# Altium footprint library th.PcbLib: 51 footprints (part 3 of 4)
Each footprint in its own frame and in the unit in brackets; x right, y up, seen from the top. Pads: shape width x height; smd on the part's side, far side on the other; paste and mask are expansions set on the pad; w line width, h text height; cw(c..) or ccw(c..) is an arc to the next point about the centre after c.
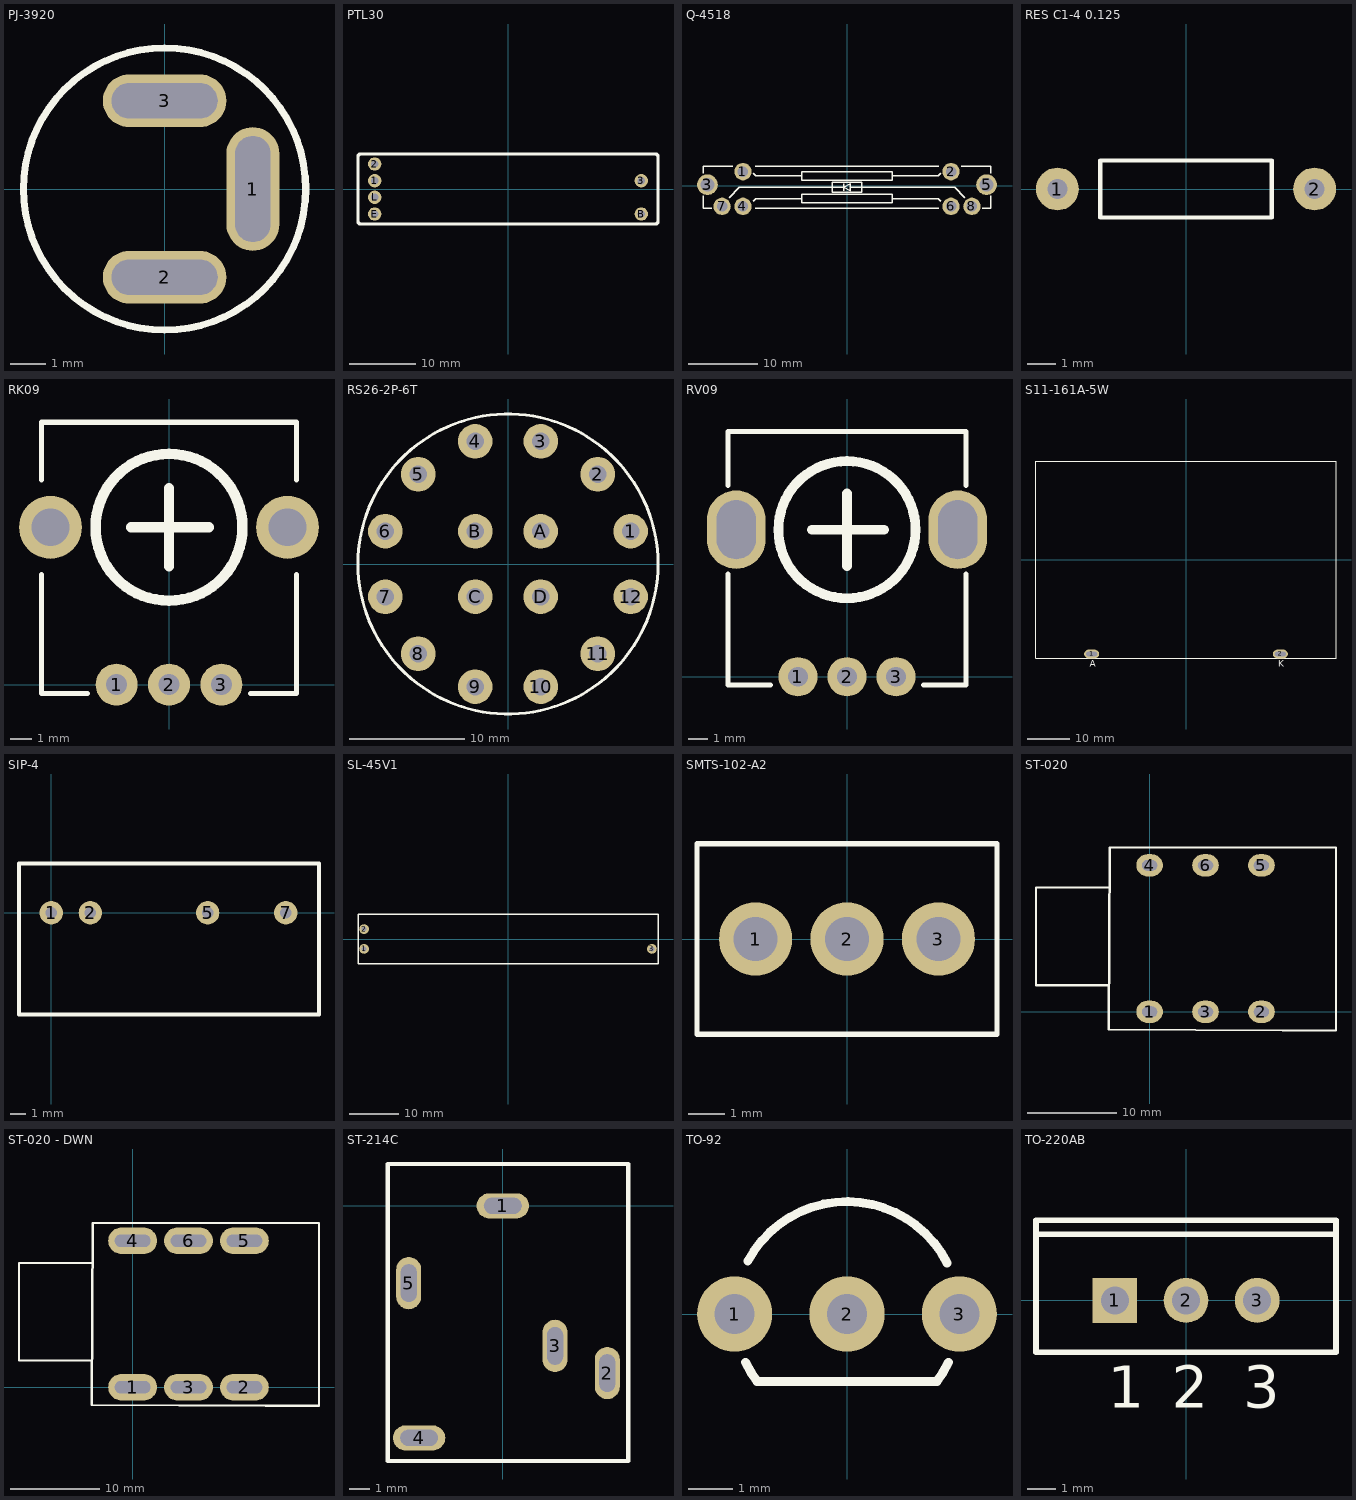
[diagram p2: the footprints below, top view; thin cyan lines are the x and y axes]

## PJ-3920 [mm] "3.5 jack"
pads (3):
  oval 1.5x3.5 hole 1 slot 3 at 90 deg: 1(2.5,0)
  oval 3.5x1.5 hole 1 slot 3 at 0 deg: 2(0,-2.5) 3(0,2.5)
Top Overlay:
  circle w0.2: c0,0 r4
3D body "PJ3920.STEP": height 16.2, standoff -6.35, extent -4,-4 4,4

## PTL30 [mm]
pads (6):
  round 2 hole 1.1: 1(-20,1.25) 2(-20,3.75) 3(20,1.25) B(20,-3.75) E(-20,-3.75) L(-20,-1.25)
Top Overlay:
  lines w0.5: -22.5,-5 -22.5,5 -22.25,5.25 22.25,5.25 22.5,5 22.5,-5 22.25,-5.25 -22.25,-5.25 -22.5,-5
3D body "PTL30.STEP": height 22.91, standoff -3.39, extent -22.5,-4.5 22.5,4.5

## Q-4518 [mm]
pads (8):
  round 2.5 hole 1.5: 1(-15,2) 2(15,2) 4(-15,-3) 6(15,-3) 7(-18,-3) 8(18,-3)
  round 3 hole 2: 3(-20.121,0.121) 5(20.121,0.121)
Top Overlay:
  lines w0.2: -20.75,-1.5 -20.75,-3.275 -19.5,-3.275 ; -20.75,1.75 -20.75,2.75 -16.5,2.75 ; -17,-1.75 -15.5,-0.25 -1.25,-0.25 -0.5,-0.25 ; -13.5,-2.25 -13.125,-1.875 -6.5,-1.875 ; -13.5,1.75 -13.125,1.375 -6.5,1.375 ; -13.25,-3.25 13.25,-3.25 ; -13.25,2.75 13.25,2.75 ; -0.5,-0.75 -0.5,0.25 ; 0.5,-0.25 1.25,-0.25 2.125,-0.25 15.5,-0.25 17,-1.75 ; 6.5,-1.875 13.125,-1.875 13.5,-2.25 ; 6.5,1.375 13.125,1.375 13.5,1.75 ; 16.5,2.75 20.75,2.75 20.75,1.75 ; 19.5,-3.275 20.75,-3.275 20.75,-1.5 ; -0.5,-0.25 0.5,-0.75 0.5,0.25 -0.5,-0.25 ; -6.5,-2.5 6.5,-2.5 6.5,-1.25 -6.5,-1.25 -6.5,-2.5 ; -6.5,0.75 -6.5,2 6.5,2 6.5,0.75 -6.5,0.75 ; -2.125,-1 -2.125,0.5 2.125,0.5 2.125,-1 -2.125,-1
3D body "Q-4518.STEP": height 28.2, standoff -4.88, extent -20.6,-3.25 20.6,2.649

## RES C1-4 0.125 [mm]
pads (2):
  round 1.5 hole 0.7: 1(-4.5,0) 2(4.5,0)
Top Overlay:
  lines w0.15: -3,-1 -3,1 3,1 3,-1 2,-1 -3,-1
3D body "C1-4.STEP": height 2.65, standoff -2.5, extent -4.74,-1.15 4.74,1.15

## RK09 [mm]
pads (5):
  round 2 hole 1: 1(-2.5,0) 2(0,0) 3(2.5,0)
  round 3 hole 1.8: " "(-5.65,7.5) " "(5.65,7.5)
Top Overlay:
  circle w0.5: c0,7.5 r3.5
  lines w0.254: -6.075,5.25 -6.075,-0.425 -3.9,-0.425 ; -6.075,9.75 -6.075,12.5 6.075,12.5 6.075,9.75 ; 3.9,-0.425 6.075,-0.425 6.075,5.25
  lines w0.5: -1.8,7.5 1.9,7.5 ; 0,5.65 0,9.35
3D body "RK09.STEP": height 26.51, standoff -4.99, extent -6,-0.4 6,12.45

## RS26-2P-6T [mm]
pads (16):
  round 3 hole 1.5: 1(10.625,2.847) 2(7.778,7.778) 3(2.847,10.625) 4(-2.847,10.625) 5(-7.778,7.778) 6(-10.625,2.847) 7(-10.625,-2.847) 8(-7.778,-7.778) 9(-2.847,-10.625) 10(2.847,-10.625) 11(7.778,-7.778) 12(10.625,-2.847) A(2.828,2.828) B(-2.828,2.828) C(-2.828,-2.828) D(2.828,-2.828)
Top Overlay:
  circle w0.254: c0,0 r13
3D body "RS26-2P-6T.STEP": height 31.01, standoff -3.99, extent -13,-13 13,13

## RV09 [mm]
pads (5):
  round 2 hole 1: 1(-2.5,0) 2(0,0) 3(2.5,0)
  oval 3x4 hole 2 slot 3 at 90 deg: " "(-5.65,7.5) " "(5.65,7.5)
Top Overlay:
  circle w0.5: c0,7.5 r3.5
  lines w0.254: -6.075,5.25 -6.075,-0.425 -3.9,-0.425 ; -6.075,9.75 -6.075,12.5 6.075,12.5 6.075,9.75 ; 3.9,-0.425 6.075,-0.425 6.075,5.25
  lines w0.5: -1.8,7.5 1.9,7.5 ; 0,5.65 0,9.35
3D body "rv09.STEP": height 19.59, standoff -2.71, extent -5.922,-0.25 5.922,12.2

## S11-161A-5W [mm]
pads (2):
  oval 3.5x2 hole 1 slot 2.5 at 0 deg: 1(-22,-22) 2(22,-22)
Top Overlay:
  lines w0.254: -22,-23 0,-23 22,-23 ; -35,-23 -35,23 35,23 35,-23 -35,-23
  text "A" at -22.5,-25 h1.52
  text "K" at 21.5,-25 h1.52
3D body: height 0, standoff -3, extent 21,-22.3 23,-21.7
3D body: height 0, standoff -3, extent -23,-22.3 -21,-21.7
3D body: height 3, standoff 0, extent -35,-23 35,23

## SIP-4 [mil]
pads (4):
  round 60 hole 30: 1(0,0) 2(100,0) 5(400,0) 7(600,0)
Top Overlay:
  lines w10: -82.68,-259.84 -82.68,125.98 685.04,125.98 685.04,-259.84 -82.68,-259.84
3D body "H05xxS-1W.STEP": height 494.09, standoff -139.76, extent -84.65,-255.91 683.07,129.92

## SL-45V1 [mm]
pads (3):
  round 2 hole 1: 1(-29.25,-2) 2(-29.25,2) 3(29.25,-2)
Top Overlay:
  lines w0.3: -30.5,-5 -30.5,5 30.5,5 30.5,-5 -30.5,-5
3D body "SL-45V1-A10K.STEP": height 16.5, standoff -2.5, extent -30,-4.75 30,4.75

## SMTS-102-A2 [mm]
pads (3):
  round 2 hole 1.2: 1(-2.5,0) 2(0,0) 3(2.5,0)
Top Overlay:
  lines w0.15: -4.1,-2.6 0,-2.6 4.1,-2.6 4.1,2.6 0,2.6 -4.1,2.6 -4.1,-2.6
3D body "SMTS-102-A2.STEP": height 27.71, standoff -5.39, extent -6,-6 6.75,6

## ST-020 [mm]
pads (6):
  oval 3x2.5 hole 1.2 slot 1.7 at 0 deg: 1(0,0) 2(12.6,0) 3(6.3,0) 4(0,16.5) 5(12.6,16.5) 6(6.3,16.5)
Top Overlay:
  lines w0.254: -4.576,3 -12.8,3 -12.8,8.5 -12.8,14 -4.522,14 ; -4.6,-2 15,-2.1 21,-2.1 21,18.5 14.5,18.5 -4.5,18.5 -4.6,-2
3D body "7-0085.STEP": height 21.95, standoff -3.29, extent -12.775,-1.8 20.525,18.2

## ST-020 - DWN [mm]
pads (6):
  oval 5.5x3 hole 1.4 slot 4 at 0 deg: 1(0,0) 2(12.6,0) 3(6.3,0) 4(0,16.5) 5(12.6,16.5) 6(6.3,16.5)
Top Overlay:
  lines w0.254: -4.576,3 -12.8,3 -12.8,8.5 -12.8,14 -4.522,14 ; -4.6,-2 15,-2.1 21,-2.1 21,18.5 14.5,18.5 -4.5,18.5 -4.6,-2
3D body "7-0085.STEP": height 16.75, standoff -8.49, extent -12.75,-1.7 20.55,18.3

## ST-214C [mm]
pads (5):
  oval 2.5x1.2 hole 0.762 slot 1.8 at 0 deg: 1(0,0) 4(-4,-11.1)
  oval 1.2x2.5 hole 0.762 slot 1.8 at 90 deg: 2(5,-8) 3(2.5,-6.7) 5(-4.5,-3.7)
Top Overlay:
  lines w0.2: -5.5,-12.2 6,-12.2 6,2 -5.5,2 -5.5,-12.2
3D body "ST-214C.STEP": height 6.01, standoff -3.49, extent -5.5,-12.2 6,5.4

## TO-92 [mm]
pads (3):
  round 1.7 hole 0.9: 1(-2.54,0) 2(0,0) 3(2.54,0)
Top Overlay:
  lines w0.2: -2.293,-1.092 ccw(c0,0) -2.032,-1.524 ; -2.242,1.194 cw(c0,0) 2.262,1.155 ; -2.032,-1.525 2.032,-1.525 ; 2.032,-1.524 ccw(c0,0) 2.293,-1.092
3D body "TO-92.STEP": height 9.22, standoff -3.49, extent -2.89,-1.6 2.89,2.6

## TO-220AB [mm]
pads (3):
  rect 1.6x1.6 hole 1: 1(-2.54,0)
  round 1.6 hole 1: 2(0,0) 3(2.54,0)
Top Overlay:
  lines w0.2: -5.35,2.35 5.35,2.35 ; -5.35,-1.85 5.35,-1.85 5.35,2.85 -5.35,2.85 -5.35,-1.85
  text "2" at -0.5,-3.825 h1.5
  text "1" at -2.79,-3.825 h1.5
  text "3" at 2.04,-3.825 h1.5
3D body "SW3dPS-POWER MOSFET, NON-SURFACE-MOUNT.STEP": height 20.3, standoff -8.08, extent -4.801,-2.25 4.851,2.25